# Altium footprint library 接插件.PcbLib: 88 footprints (part 4 of 6)
Each footprint in its own frame and in the unit in brackets; x right, y up, seen from the top. Pads: shape width x height; smd on the part's side, far side on the other; paste and mask are expansions set on the pad; w line width, h text height; cw(c..) or ccw(c..) is an arc to the next point about the centre after c.
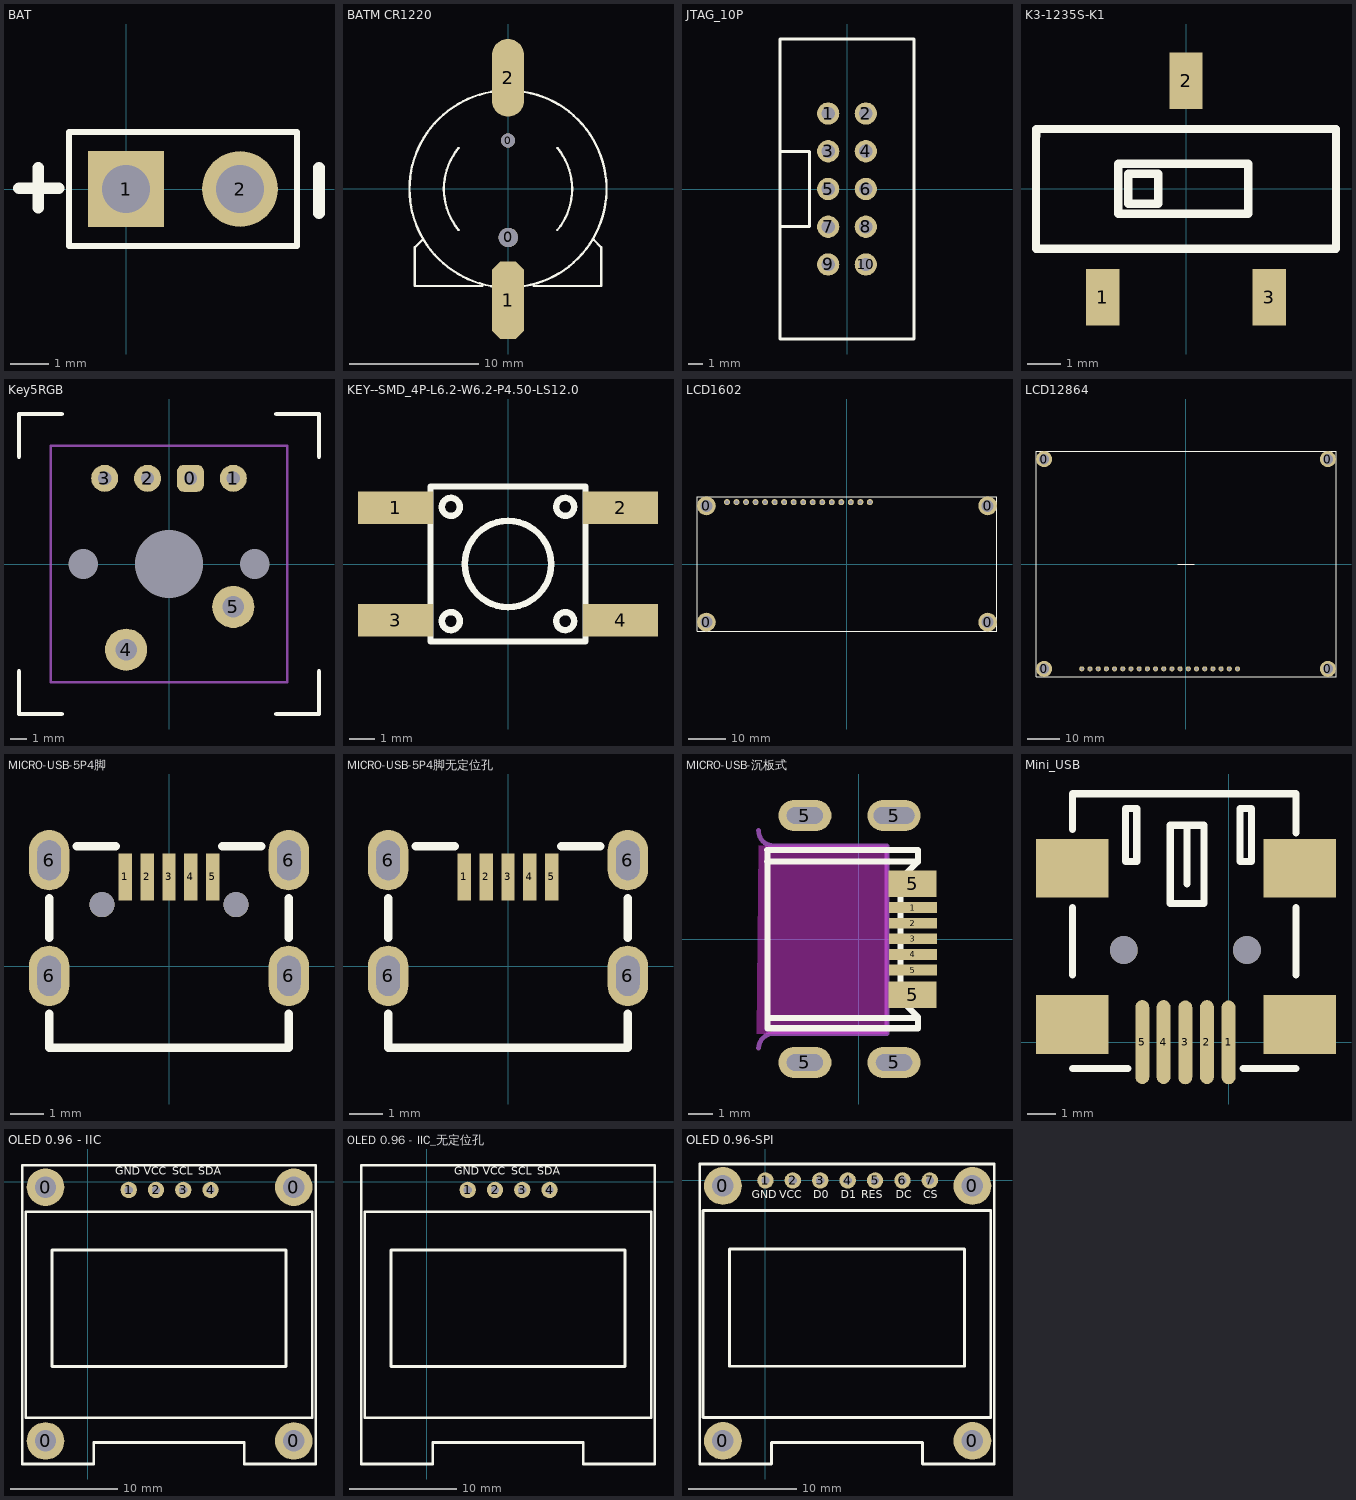
[diagram p3: the footprints below, top view; thin cyan lines are the x and y axes]

## BAT [mm]
pads (2):
  rect 2x2 hole 1.27: 1(0,0)
  round 2 hole 1.27: 2(3,0)
Top Overlay:
  lines w0.152: -1.5,-1.5 4.5,-1.5 4.5,1.5 -1.5,1.5 -1.5,-1.5
  lines w0.305: -2.819,0.023 -1.769,0.023 ; -2.314,-0.492 -2.314,0.559 ; 5.08,-0.641 5.08,0.559

## BATM CR1220 [mm]
pads (4):
  round 1.1 hole 1.1 unplated: 0(0,3.748)
  round 1.5 hole 1.5 unplated: 0(0.025,-3.752)
  oct 2.5x6 smd: 1(0,-8.602)
  oval 2.5x6 smd: 2(0,8.598)
Top Overlay:
  lines w0.178: -6.6,-3.902 -7.2,-4.502 -7.2,-7.502 -2,-7.502 ; -3.815,-3.171 cw(c0,-0.002) -3.812,3.171 ; -0.833,-7.576 cw(c0,-0.002) -7.62,-0.002 cw(c0,-0.002) -0.833,7.573 ; 0.833,-7.576 ccw(c0,-0.002) 0.833,7.573 ; 2,-7.502 7.2,-7.502 7.2,-4.502 6.625,-3.927 ; 3.81,-3.177 ccw(c0,-0.002) 3.812,3.171

## joystick_ok [mm]

## JTAG_10P [mm] "JTAG_10P"
pads (10):
  round 1.5 hole 0.9: 1(-1.27,5.08) 2(1.27,5.08) 3(-1.27,2.54) 4(1.27,2.54) 5(-1.27,0) 6(1.27,0) 7(-1.27,-2.54) 8(1.27,-2.54) 9(-1.27,-5.08) 10(1.27,-5.08)
Top Overlay:
  lines w0.2: -4.5,-2.54 -2.54,-2.54 -2.54,2.54 -4.5,2.54 ; -4.5,-10.1 -4.5,10.1 4.5,10.1 4.5,-10.1 -4.5,-10.1
3D body "User Library-IDC Socket Male 10pin Straight THT Goldplated 2_54mm.step": height 9.03, standoff -3.37, extent -4.425,-10.15 4.425,10.15

## K3-1235S-K1 [mm]
pads (3):
  rect 1x1.7 smd: 1(-2.5,-3.25) 2(-0.002,3.25) 3(2.5,-3.25)
Top Overlay:
  lines w0.254: -4.502,-1.799 -4.502,1.284 -4.5,1.8 4.499,1.8 4.499,-1.799 -4.502,-1.799 ; -2.032,-0.738 -2.032,0.762 1.868,0.762 1.868,-0.738 -2.032,-0.738 ; -1.732,-0.438 -0.832,-0.438 -0.832,0.462 -1.732,0.462 -1.732,-0.438

## Key5RGB [mm]
pads (9):
  rrect50% 1.6x1.6 hole 0.787: 0(1.27,5.08)
  round 1.6 hole 0.787: 1(3.81,5.08) 2(-1.27,5.08) 3(-3.81,5.08)
  round 2.5 hole 1.27: 4(-2.54,-5.08) 5(3.81,-2.54)
  round 1.7 hole 1.753: ""(-5.08,0) ""(5.08,0)
  round 4 hole 4.013: ""(0,0)
Top Overlay:
  lines w0.254: -8.89,-6.35 -8.89,-8.89 -6.35,-8.89 ; -8.89,6.35 -8.89,8.89 -6.35,8.89 ; 6.35,-8.89 8.89,-8.89 8.89,-6.35 ; 6.35,8.89 8.89,8.89 8.89,6.35
Mechanical 1:
  lines w0.152: -7,-7 -7,7 -3.5,7 3.5,7 7,7 7,-7 3.5,-7 -3.5,-7 -7,-7
3D body "User Library-MX-Blue.STEP": height 15.47, standoff -3.43, extent -7.8,-7.726 7.8,7.874

## KEY--SMD_4P-L6.2-W6.2-P4.50-LS12.0 [mm]
pads (4):
  rect 3x1.3 smd: 1(-4.5,2.25) 2(4.5,2.25) 3(-4.5,-2.25) 4(4.5,-2.25)
Top Overlay:
  circle w0.254: c0,0 r1.727
  circle w0.254: c-2.286,2.286 r0.359
  circle w0.254: c2.286,2.286 r0.359
  circle w0.254: c-2.286,-2.286 r0.359
  circle w0.254: c2.286,-2.286 r0.359
  lines w0.254: -3.1,-3.1 3.1,-3.1 3.1,3.1 -3.1,3.1 -3.1,-3.1

## LCD1602 [mm]
height 20.4
pads (20):
  round 5 hole 3.2: 0(-37.5,-15.5) 0(-37.5,15.5) 0(37.5,-15.5) 0(37.5,15.5)
  round 1.6 hole 1: 1(-32,16.5) 2(-29.46,16.5) 3(-26.92,16.5) 4(-24.38,16.5) 5(-21.84,16.5) 6(-19.3,16.5) 7(-16.76,16.5) 8(-14.22,16.5) 9(-11.68,16.5) 10(-9.14,16.5) 11(-6.6,16.5) 12(-4.06,16.5) 13(-1.52,16.5) 14(1.02,16.5) 15(3.56,16.5) 16(6.1,16.5)
Top Overlay:
  lines w0.254: -40,-18 -40,18 40,18 40,-18 -40,-18
3D body "LCD1602.STEP": height 18.7, standoff -4, extent -40.005,-17.966 39.995,18.034

## LCD12864 [mm] "2.54mm"
height 10
pads (24):
  round 5 hole 3.2: 0(-44,-32.5) 0(-44,32.5) 0(44,-32.5) 0(44,32.5)
  round 1.6 hole 0.9: 1(15.96,-32.5) 2(13.42,-32.5) 3(10.88,-32.5) 4(8.34,-32.5) 5(5.8,-32.5) 6(3.26,-32.5) 7(0.72,-32.5) 8(-1.82,-32.5) 9(-4.36,-32.5) 10(-6.9,-32.5) 11(-9.44,-32.5) 12(-11.98,-32.5) 13(-14.52,-32.5) 14(-17.06,-32.5) 15(-19.6,-32.5) 16(-22.14,-32.5) 17(-24.68,-32.5) 18(-27.22,-32.5) 19(-29.76,-32.5) 20(-32.3,-32.5)
Top Overlay:
  lines w0.254: -2.54,0 2.54,0 ; -46.5,-35 -46.5,35 46.5,35 46.5,-35 -46.5,-35
3D body "LCD12864.STEP": height 17.2, standoff -5.6, extent -46.5,-35.052 46.5,34.948

## MICRO-USB-5P4脚 [mm]
pads (11):
  rect 0.4x1.4 smd: 1(-1.3,2.66) 2(-0.65,2.66) 3(0,2.66) 4(0.65,2.66) 5(1.3,2.66)
  oval 1.2x1.8 hole 0.7 slot 1.2 at 90 deg: 6(-3.575,-0.29) 6(-3.575,3.16) 6(3.575,-0.29) 6(3.575,3.16)
  round 0.75 hole 0.75 unplated: ""(-2,1.835) ""(2,1.835)
Top Overlay:
  lines w0.254: -3.575,-1.421 -3.575,-2.44 3.575,-2.44 3.575,-1.421 ; -3.575,0.841 -3.575,2.029 ; -2.751,3.571 -1.592,3.571 ; 1.592,3.571 2.751,3.571 ; 3.575,0.841 3.575,2.029

## MICRO-USB-5P4脚无定位孔 [mm]
pads (9):
  rect 0.4x1.4 smd: 1(-1.3,2.66) 2(-0.65,2.66) 3(0,2.66) 4(0.65,2.66) 5(1.3,2.66)
  oval 1.2x1.8 hole 0.7 slot 1.2 at 90 deg: 6(-3.575,-0.29) 6(-3.575,3.16) 6(3.575,-0.29) 6(3.575,3.16)
Top Overlay:
  lines w0.254: -3.575,-1.421 -3.575,-2.44 3.575,-2.44 3.575,-1.421 ; -3.575,0.841 -3.575,2.029 ; -2.751,3.571 -1.592,3.571 ; 1.592,3.571 2.751,3.571 ; 3.575,0.841 3.575,2.029

## MICRO-USB-沉板式 [mm]
pads (11):
  rect 2x0.45 smd: 1(2.243,1.307) 2(2.243,0.656) 3(2.243,0.007) 4(2.243,-0.643) 5(2.243,-1.293)
  oval 2.2x1.3 hole 0.7 slot 1.5 at 0 deg: 5(-2.243,-5.126) 5(-2.243,5.126) 5(1.458,-5.126)
  oval 2.2x1.3 hole 0.7 slot 1.701 at 0 deg: 5(1.458,5.126)
  rect 2x1.1 smd: 5(2.228,-2.304) 5(2.228,2.296)
Top Overlay:
  lines w0.254: -3.812,3.217 2.436,3.217 ; -3.812,3.697 2.449,3.697 ; -3.802,3.697 -3.802,-3.705 2.449,-3.705 2.449,-3.235 1.737,-2.524 ; -3.792,-3.273 2.459,-3.273 ; 1.727,-2.503 1.727,2.495 ; 1.737,2.498 2.449,3.207 2.449,3.676
Keep-Out Layer:
  board cut-out: -4.163,3.873 1.171,3.873 1.171,-3.933 -4.183,-3.923 -4.233,-3.923
Mechanical 1:
  lines w0.2: -4.163,-4.53 cw(c-3.545,-4.541) -3.534,-3.923 1.161,-3.923 1.171,-3.933 1.171,3.873 -3.556,3.873 cw(c-3.545,4.491) -4.163,4.502

## Mini_USB [mm]
pads (11):
  oval 0.5x3 smd: 1(0,0) 2(-0.775,0.009) 3(-1.549,0) 4(-2.324,0.009) 5(-3.086,0.009)
  rect 2.6x2.1 smd: ""(-5.588,0.635) ""(-5.588,6.223) ""(2.54,0.635) ""(2.54,6.223)
  round 1 hole 1: ""(-3.749,3.299) ""(0.651,3.299)
Top Overlay:
  lines w0.254: -5.588,2.413 -5.588,4.826 ; -5.586,-0.938 -3.607,-0.938 ; -5.586,7.62 -5.586,8.89 2.414,8.89 2.414,7.493 ; -1.486,5.662 -1.486,7.762 ; 0.514,-0.938 2.414,-0.938 ; 2.413,2.413 2.413,4.826 ; -3.686,6.462 -3.286,6.462 -3.286,8.362 -3.686,8.362 -3.686,6.462 ; -2.086,4.962 -2.086,7.762 -0.886,7.762 -0.886,4.962 -2.086,4.962 ; 0.414,6.462 0.814,6.462 0.814,8.362 0.414,8.362 0.414,6.462

## OLED 0.96 - IIC [mil]
pads (8):
  round 137.8 hole 78.74: 0(-155,-950) 0(-155,-20) 0(755,-950) 0(755,-20)
  round 60 hole 30: 1(150,-30) 2(250,-30) 3(350,-30) 4(450,-30)
Top Overlay:
  lines w10: -239.8,-1034.49 -239.8,60 835,60 835,-1034.49 573.19,-1034.49 573.19,-955.75 22.01,-955.75 22.01,-1034.49 -239.8,-1034.49 ; -227.5,-865 -227.5,-110 822.5,-110 822.5,-865 -227.5,-865 ; -131.25,-677.5 -131.25,-250 726.25,-250 726.25,-677.5 -131.25,-677.5
  text "VCC" at 205,15 h50
  text "GND" at 100,15 h50
  text "SCL" at 310,15 h50
  text "SDA" at 405,15 h50
3D body "OLED带PCB.step": height 333.57, standoff -93.43, extent -227.57,-1035.59 823.61,61.26

## OLED 0.96 - IIC_无定位孔 [mil]
pads (4):
  round 60 hole 30: 1(150,-30) 2(250,-30) 3(350,-30) 4(450,-30)
Top Overlay:
  lines w10: -239.8,-1034.49 22.01,-1034.49 22.01,-955.75 573.19,-955.75 573.19,-1034.49 835,-1034.49 835,60 -239.8,60 -239.8,-1034.49 ; -227.5,-865 822.5,-865 822.5,-110 -227.5,-110 -227.5,-865 ; -131.25,-677.5 726.25,-677.5 726.25,-250 -131.25,-250 -131.25,-677.5
  text "SDA" at 405,15 h50
  text "SCL" at 310,15 h50
  text "GND" at 100,15 h50
  text "VCC" at 205,15 h50
3D body "OLED带PCB.step": height 333.57, standoff -93.43, extent -227.57,-1035.59 823.61,61.26

## OLED 0.96-SPI [mil]
pads (11):
  round 137.8 hole 78.74: 0(-155,-950) 0(-155,-20) 0(755,-950) 0(755,-20)
  round 60 hole 30: 1(0,0) 2(100,0) 3(200,0) 4(300,0) 5(400,0) 6(500,0) 7(600,0)
Top Overlay:
  lines w10: -239.8,-1034.49 -239.8,60 835,60 835,-1034.49 573.19,-1034.49 573.19,-955.75 22.01,-955.75 22.01,-1034.49 -239.8,-1034.49 ; -227.5,-865 -227.5,-110 822.5,-110 822.5,-865 -227.5,-865 ; -131.25,-677.5 -131.25,-250 726.25,-250 726.25,-677.5 -131.25,-677.5
  text "CS" at 575,-75 h50
  text "DC" at 475,-75 h50
  text "RES" at 350,-75 h50
  text "D1" at 275,-75 h50
  text "D0" at 175,-75 h50
  text "VCC" at 50,-75 h50
  text "GND" at -50,-75 h50
3D body "OLED带PCB.step": height 333.57, standoff -93.43, extent -227.57,-1035.59 823.61,61.26